# Altium integrated library RF Module.IntLib: 92 symbols (part 1 of 2) (continued)
## 10932 (continued)

## 10933
designator A?, comment XBP24-ASI-001
MODULE XBEE PRO W/RPSMA; Manufacturer: Digi International; Protocol: Zigbee; Frequency: 2.4GHz; DataRate: 250kbps; Power - Output: 18dBm; Sensitivity: -100dBm; Serial Interfaces: UART; Antenna Type: Not Included, RP-SMA; Voltage - Supply: 2.8 V ~ 3.4 V; Current - Receiving: 55mA; Current - Transmitting: 340mA; PartId: 10933; Part Number: XBP24-ASI-001; Supplier 1: Digi-Key; Supplier Part Number 1: XBP24-ASI-001-ND; ComponentLink1Description: Datasheet; ComponentLink1URL: http://www.digi.com/pdf/ds_xbeemultipointmodules.pdf; ComponentLink2Description: Digi-Key Listing; ComponentLink2URL: https://www.digikey.com/product-detail/en/digi-international/XBP24-ASI-001/XBP24-ASI-001-ND/2175373; Price: 47.44; Device Package: Module; Operating Temperature: -40C ~ 85C; RF Family/Standard: 802.15.4; Mounting Type: Through Hole
footprint DIGI XBEE PRO RPSMA FOR HDR
text: AD0/DIO0; VCC; AD1/DIO1; DOUT; AD2/DIO2; DIN/CONFIG; AD3/DIO3; DO8; RTS/AD6/DIO6; RESET; ASSOC/AD5/DIO5; PWM0/RSSI; VREF; PWM1; ON/SLEEP; N/C; CTS/DIO7; DTR/SLEEP_RQ/DI8; AD4/DIO4; GND

## 10934
designator A?, comment XBP24-DMSIT-250
XBEE PRO DIGIMESH 2.4GHZ 63MW; Manufacturer: Digi International; RF Family/Standard: General ISM &gt; 1GHZ; Modulation: DSSS; DataRate: 250kbps; Power - Output: 18dBm; Sensitivity: -100dBm; Serial Interfaces: UART; Antenna Type: Not Included, RP-SMA; Voltage - Supply: 2.8 V ~ 3.4 V; Current - Receiving: 55mA; Current - Transmitting: 340mA; PartId: 10934; Part Number: XBP24-DMSIT-250; Supplier 1: Digi-Key; Supplier Part Number 1: 602-1281-ND; ComponentLink1Description: Datasheet; ComponentLink1URL: http://www.digi.com/pdf/ds_xbeedigimesh24.pdf; ComponentLink2Description: Digi-Key Listing; ComponentLink2URL: https://www.digikey.com/product-detail/en/digi-international/XBP24-DMSIT-250/602-1281-ND/3482755; Price: 47.44; Device Package: Module; Operating Temperature: -40C ~ 85C; Frequency: 2.4GHz; Mounting Type: Through Hole
footprint DIGI XBEE PRO RPSMA FOR HDR
text: AD0/DIO0; VCC; AD1/DIO1; DOUT; AD2/DIO2; DIN/CONFIG; AD3/DIO3; DO8; RTS/AD6/DIO6; RESET; ASSOC/AD5/DIO5; PWM0/RSSI; VREF; PWM1; ON/SLEEP; N/C; CTS/DIO7; DTR/SLEEP_RQ/DI8; AD4/DIO4; GND

## 10935
designator A?, comment XBP9B-DMST-002
MODULE XBEE PRO S3B 900HP RPSMA; Manufacturer: Digi International; RF Family/Standard: General ISM &lt; 1GHz; Modulation: FHSS; Frequency: 900MHz; DataRate: 200kbps; Power - Output: 24dBm; Sensitivity: -101dBm; Serial Interfaces: UART; Antenna Type: Not Included, RP-SMA; Voltage - Supply: 2.1 V ~ 3.6 V; Current - Receiving: 29mA; Current - Transmitting: 215mA; PartId: 10935; Part Number: XBP9B-DMST-002; Supplier 1: Digi-Key; Supplier Part Number 1: 602-1299-ND; ComponentLink1Description: Datasheet; ComponentLink1URL: http://www.digi.com/pdf/ds_xbeepro900hp.pdf; ComponentLink2Description: Digi-Key Listing; ComponentLink2URL: https://www.digikey.com/product-detail/en/digi-international/XBP9B-DMST-002/602-1299-ND/3594157; Price: 54.41; Device Package: Module; Operating Temperature: -40C ~ 85C; Mounting Type: Through Hole
footprint DIGI XBEE PRO RPSMA FOR HDR
text: AD0/DIO0; VCC; AD1/DIO1; DOUT; AD2/DIO2; DIN/CONFIG; AD3/DIO3; DO8; RTS/AD6/DIO6; RESET; ASSOC/AD5/DIO5; PWM0/RSSI; VREF; PWM1; ON/SLEEP; N/C; CTS/DIO7; DTR/SLEEP_RQ/DI8; AD4/DIO4; GND

## 10936
designator A?, comment XBP9B-DPST-001
MODULE XBEE PRO S3B 900HP RPSMA; Manufacturer: Digi International; RF Family/Standard: General ISM &lt; 1GHz; Modulation: FHSS; Frequency: 902MHz ~ 928MHz; DataRate: 200kbps; Power - Output: 24dBm; Sensitivity: -101dBm; Serial Interfaces: SPI, UART; Antenna Type: Not Included, RP-SMA; Voltage - Supply: 2.1 V ~ 3.6 V; Current - Receiving: 29mA; Current - Transmitting: 215mA; PartId: 10936; Part Number: XBP9B-DPST-001; Supplier 1: Digi-Key; Supplier Part Number 1: 602-1349-ND; ComponentLink1Description: Datasheet; ComponentLink1URL: http://www.digi.com/pdf/ds_xbeepro900hp.pdf; ComponentLink2Description: Digi-Key Listing; ComponentLink2URL: https://www.digikey.com/product-detail/en/digi-international/XBP9B-DPST-001/602-1349-ND/3594160; Price: 54.41; Device Package: Module; Operating Temperature: -40C ~ 85C; Mounting Type: Through Hole
footprint DIGI XBEE PRO RPSMA FOR HDR
text: AD0/DIO0; VCC; AD1/DIO1; DOUT; AD2/DIO2; DIN/CONFIG; AD3/DIO3; DO8; RTS/AD6/DIO6; RESET; ASSOC/AD5/DIO5; PWM0/RSSI; VREF; PWM1; ON/SLEEP; N/C; CTS/DIO7; DTR/SLEEP_RQ/DI8; AD4/DIO4; GND

## 10937
designator A?, comment XBP9B-DMSTB002
XBEE PRO DIGIMSH S3B 900HP RPSMA; Manufacturer: Digi International; RF Family/Standard: General ISM &lt; 1GHz; Modulation: FHSS; Frequency: 900MHz; DataRate: 200kbps; Power - Output: 24dBm; Sensitivity: -101dBm; Serial Interfaces: SPI, UART; Antenna Type: Not Included, RP-SMA; Memory Size: 32kB Flash, 2kB RAM; Voltage - Supply: 2.1 V ~ 3.6 V; Current - Receiving: 44mA; Current - Transmitting: 229mA; PartId: 10937; Part Number: XBP9B-DMSTB002; Supplier 1: Digi-Key; Supplier Part Number 1: 602-1346-ND; ComponentLink1Description: Datasheet; ComponentLink1URL: http://www.digi.com/pdf/ds_xbeepro900hp.pdf; ComponentLink2Description: Digi-Key Listing; ComponentLink2URL: https://www.digikey.com/product-detail/en/digi-international/XBP9B-DMSTB002/602-1346-ND/3863548; Price: 58.25; Device Package: Module; Operating Temperature: -40C ~ 85C; Mounting Type: Through Hole
footprint DIGI XBEE PRO RPSMA FOR HDR
text: AD0/DIO0; VCC; AD1/DIO1; DOUT; AD2/DIO2; DIN/CONFIG; AD3/DIO3; DO8; RTS/AD6/DIO6; RESET; ASSOC/AD5/DIO5; PWM0/RSSI; VREF; PWM1; ON/SLEEP; N/C; CTS/DIO7; DTR/SLEEP_RQ/DI8; AD4/DIO4; GND

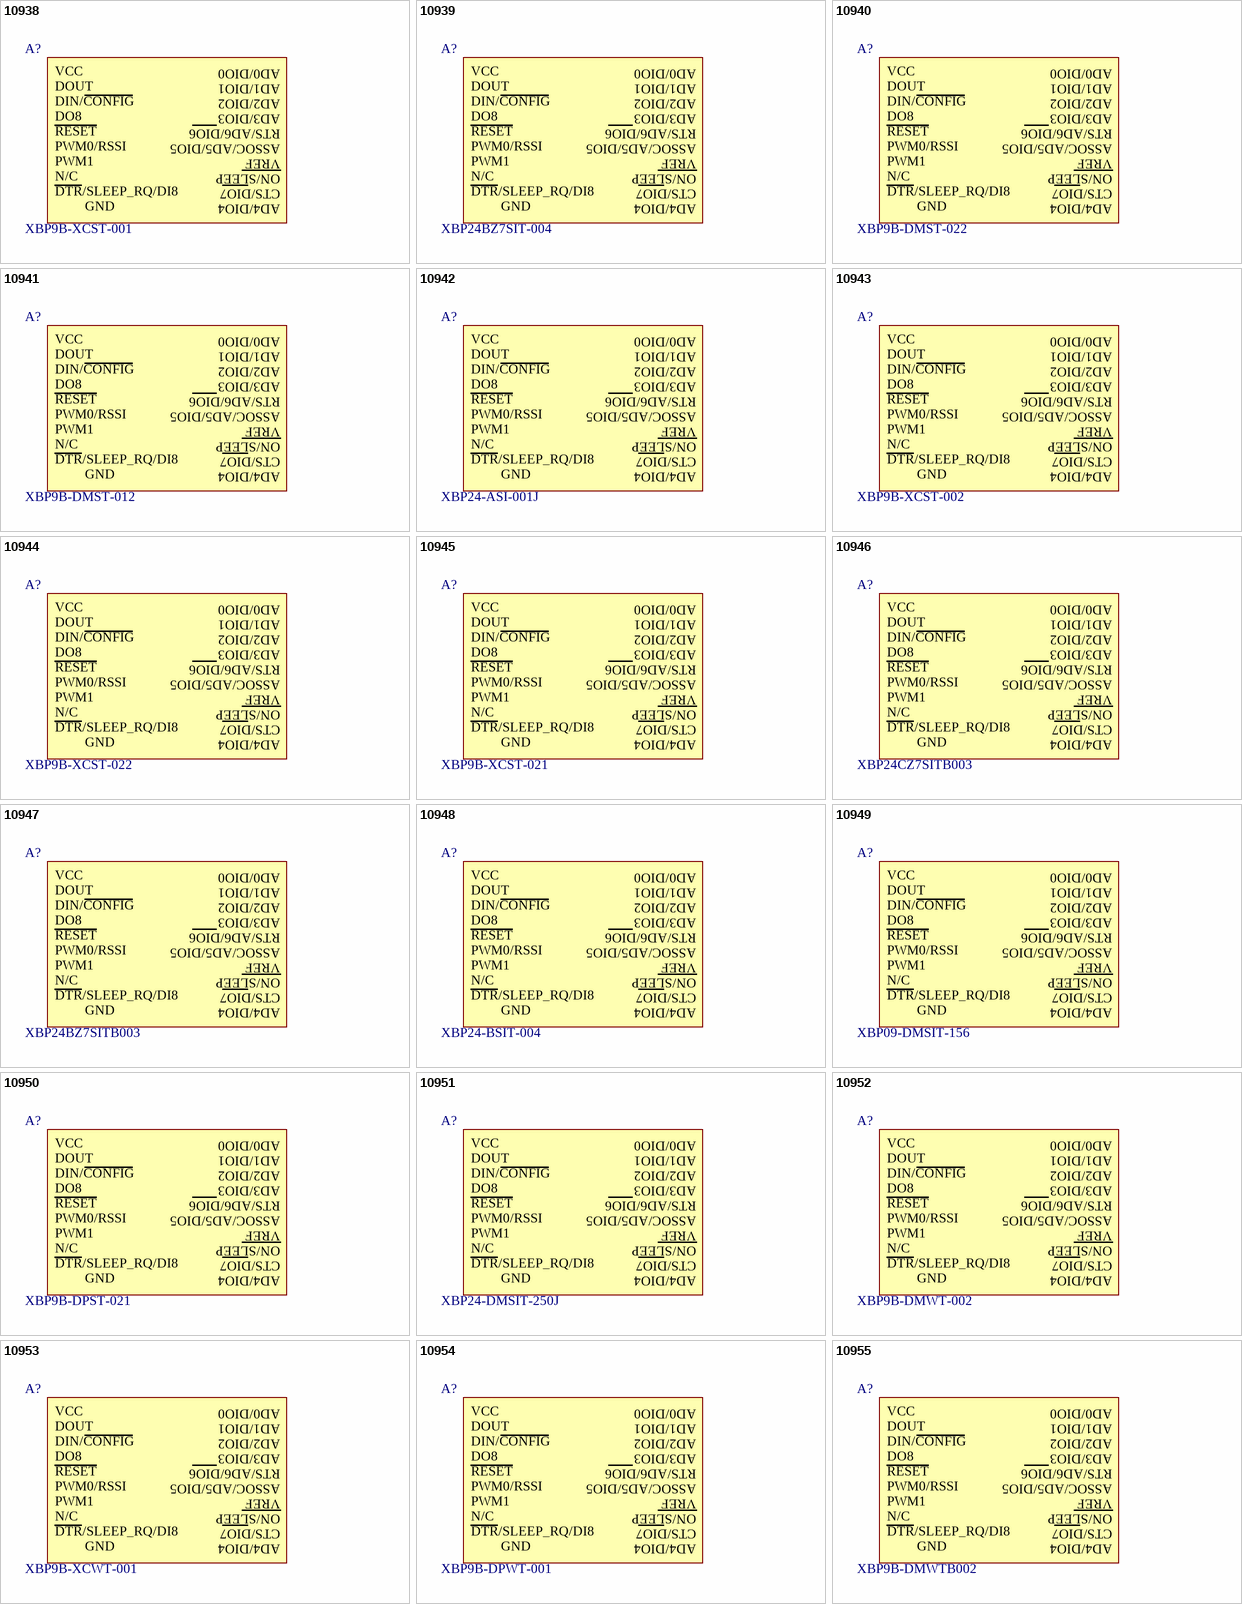
[diagram p3: symbols 10938 to 10955]

## 10938
designator A?, comment XBP9B-XCST-001
XBEE PRO XSC S3B 900MHZ 250MW; Manufacturer: Digi International; RF Family/Standard: General ISM &lt; 1GHz; Modulation: FHSS; Frequency: 902MHz ~ 928MHz; DataRate: 20kbps; Power - Output: 24dBm; Sensitivity: -109dBm; Serial Interfaces: SPI, UART; Antenna Type: Not Included, RP-SMA; Voltage - Supply: 2.4 V ~ 3.6 V; Current - Receiving: 26mA; Current - Transmitting: 215mA; PartId: 10938; Part Number: XBP9B-XCST-001; Supplier 1: Digi-Key; Supplier Part Number 1: 602-1293-ND; ComponentLink1Description: Datasheet; ComponentLink1URL: http://www.digi.com/pdf/ds_xbeeproxsc.pdf; ComponentLink2Description: Digi-Key Listing; ComponentLink2URL: https://www.digikey.com/product-detail/en/digi-international/XBP9B-XCST-001/602-1293-ND/3482817; Price: 58.6; Device Package: Module; Operating Temperature: -40C ~ 85C; Mounting Type: Through Hole
footprint DIGI XBEE PRO RPSMA FOR HDR
text: AD0/DIO0; VCC; AD1/DIO1; DOUT; AD2/DIO2; DIN/CONFIG; AD3/DIO3; DO8; RTS/AD6/DIO6; RESET; ASSOC/AD5/DIO5; PWM0/RSSI; VREF; PWM1; ON/SLEEP; N/C; CTS/DIO7; DTR/SLEEP_RQ/DI8; AD4/DIO4; GND

## 10939
designator A?, comment XBP24BZ7SIT-004
MODULE ZIGBEE-PRO W/RPSMA ANT; Manufacturer: Digi International; Protocol: Zigbee; Frequency: 2.4GHz; DataRate: 250kbps; Power - Output: 18dBm; Sensitivity: -102dBm; Serial Interfaces: IC, PWM, SPI, UART; Antenna Type: Not Included, RP-SMA; Voltage - Supply: 2.7 V ~ 3.6 V; Current - Receiving: 47mA; Current - Transmitting: 205mA; PartId: 10939; Part Number: XBP24BZ7SIT-004; Supplier 1: Digi-Key; Supplier Part Number 1: 602-1180-ND; ComponentLink1Description: Datasheet; ComponentLink1URL: //media.digikey.com/pdf/Data%20Sheets/Digi%20International%20PDFs/xbeezbmodule_ds.pdf; ComponentLink2Description: Digi-Key Listing; ComponentLink2URL: https://www.digikey.com/product-detail/en/digi-international/XBP24BZ7SIT-004/602-1180-ND/2344900; Price: 40.46; Device Package: Module; Operating Temperature: -40C ~ 85C; RF Family/Standard: 802.15.4; Mounting Type: Through Hole
footprint DIGI XBEE PRO RPSMA FOR HDR
text: AD0/DIO0; VCC; AD1/DIO1; DOUT; AD2/DIO2; DIN/CONFIG; AD3/DIO3; DO8; RTS/AD6/DIO6; RESET; ASSOC/AD5/DIO5; PWM0/RSSI; VREF; PWM1; ON/SLEEP; N/C; CTS/DIO7; DTR/SLEEP_RQ/DI8; AD4/DIO4; GND

## 10940
designator A?, comment XBP9B-DMST-022
XBEE PRO RPSMA 250MW 200KBPS; Manufacturer: Digi International; RF Family/Standard: General ISM &lt; 1GHz; Modulation: FHSS; Frequency: 920MHz; Power - Output: 24dBm; Sensitivity: -101dBm; Serial Interfaces: UART; Antenna Type: Not Included, RP-SMA; Voltage - Supply: 2.1 V ~ 3.6 V; Current - Receiving: 29mA; Current - Transmitting: 215mA; PartId: 10940; Part Number: XBP9B-DMST-022; Supplier 1: Digi-Key; Supplier Part Number 1: XBP9B-DMST-022-ND; ComponentLink1Description: Datasheet; ComponentLink1URL: http://www.digi.com/pdf/ds_xbeepro900hp.pdf; ComponentLink2Description: Digi-Key Listing; ComponentLink2URL: https://www.digikey.com/product-detail/en/digi-international/XBP9B-DMST-022/XBP9B-DMST-022-ND/3728682; Price: 54.41; Device Package: Module; Operating Temperature: -40C ~ 85C; DataRate: 200kbps; Mounting Type: Through Hole
footprint DIGI XBEE PRO RPSMA FOR HDR
text: AD0/DIO0; VCC; AD1/DIO1; DOUT; AD2/DIO2; DIN/CONFIG; AD3/DIO3; DO8; RTS/AD6/DIO6; RESET; ASSOC/AD5/DIO5; PWM0/RSSI; VREF; PWM1; ON/SLEEP; N/C; CTS/DIO7; DTR/SLEEP_RQ/DI8; AD4/DIO4; GND

## 10941
designator A?, comment XBP9B-DMST-012
XBEE PRO DIGMESH S3B 900HP RPSMA; Manufacturer: Digi International; RF Family/Standard: General ISM &lt; 1GHz; Modulation: FHSS; Frequency: 902MHz ~ 928MHz; DataRate: 200kbps; Power - Output: 24dBm; Sensitivity: -101dBm; Serial Interfaces: UART; Antenna Type: Not Included, RP-SMA; Voltage - Supply: 2.1 V ~ 3.6 V; Current - Receiving: 29mA; Current - Transmitting: 215mA; PartId: 10941; Part Number: XBP9B-DMST-012; Supplier 1: Digi-Key; Supplier Part Number 1: 602-1304-ND; ComponentLink1Description: Datasheet; ComponentLink1URL: http://www.digi.com/pdf/ds_xbeepro900hp.pdf; ComponentLink2Description: Digi-Key Listing; ComponentLink2URL: https://www.digikey.com/product-detail/en/digi-international/XBP9B-DMST-012/602-1304-ND/3911190; Price: 54.41; Device Package: Module; Operating Temperature: -40C ~ 85C; Mounting Type: Through Hole
footprint DIGI XBEE PRO RPSMA FOR HDR
text: AD0/DIO0; VCC; AD1/DIO1; DOUT; AD2/DIO2; DIN/CONFIG; AD3/DIO3; DO8; RTS/AD6/DIO6; RESET; ASSOC/AD5/DIO5; PWM0/RSSI; VREF; PWM1; ON/SLEEP; N/C; CTS/DIO7; DTR/SLEEP_RQ/DI8; AD4/DIO4; GND

## 10942
designator A?, comment XBP24-ASI-001J
XBEE PRO 802.15.4 10MW RPSMA; Manufacturer: Digi International; Protocol: Zigbee; Frequency: 2.4GHz; DataRate: 250kbps; Power - Output: 10dBm; Sensitivity: -100dBm; Serial Interfaces: UART; Antenna Type: Not Included, RP-SMA; Voltage - Supply: 2.8 V ~ 3.4 V; Current - Receiving: 55mA; Current - Transmitting: 180mA; PartId: 10942; Part Number: XBP24-ASI-001J; Supplier 1: Digi-Key; Supplier Part Number 1: 602-1478-ND; ComponentLink1Description: Datasheet; ComponentLink1URL: http://www.digi.com/pdf/ds_xbeemultipointmodules.pdf; ComponentLink2Description: Digi-Key Listing; ComponentLink2URL: https://www.digikey.com/product-detail/en/digi-international/XBP24-ASI-001J/602-1478-ND/3482670; Price: 47.44; Device Package: Module; Operating Temperature: -40C ~ 85C; RF Family/Standard: 802.15.4; Mounting Type: Through Hole
footprint DIGI XBEE PRO RPSMA FOR HDR
text: AD0/DIO0; VCC; AD1/DIO1; DOUT; AD2/DIO2; DIN/CONFIG; AD3/DIO3; DO8; RTS/AD6/DIO6; RESET; ASSOC/AD5/DIO5; PWM0/RSSI; VREF; PWM1; ON/SLEEP; N/C; CTS/DIO7; DTR/SLEEP_RQ/DI8; AD4/DIO4; GND

## 10943
designator A?, comment XBP9B-XCST-002
XBEE PRO XSC S3B 900MHZ 250MW; Manufacturer: Digi International; RF Family/Standard: General ISM &lt; 1GHz; Modulation: FHSS; Frequency: 902MHz ~ 928MHz; DataRate: 20kbps; Power - Output: 24dBm; Sensitivity: -107dBm; Serial Interfaces: SPI, UART; Antenna Type: Not Included, RP-SMA; Voltage - Supply: 2.4 V ~ 3.6 V; Current - Receiving: 26mA; Current - Transmitting: 215mA; PartId: 10943; Part Number: XBP9B-XCST-002; Supplier 1: Digi-Key; Supplier Part Number 1: 602-1294-ND; ComponentLink1Description: Datasheet; ComponentLink1URL: http://www.digi.com/pdf/ds_xbeeproxsc.pdf; ComponentLink2Description: Digi-Key Listing; ComponentLink2URL: https://www.digikey.com/product-detail/en/digi-international/XBP9B-XCST-002/602-1294-ND/3482818; Price: 58.6; Device Package: Module; Operating Temperature: -40C ~ 85C; Mounting Type: Through Hole
footprint DIGI XBEE PRO RPSMA FOR HDR
text: AD0/DIO0; VCC; AD1/DIO1; DOUT; AD2/DIO2; DIN/CONFIG; AD3/DIO3; DO8; RTS/AD6/DIO6; RESET; ASSOC/AD5/DIO5; PWM0/RSSI; VREF; PWM1; ON/SLEEP; N/C; CTS/DIO7; DTR/SLEEP_RQ/DI8; AD4/DIO4; GND

## 10944
designator A?, comment XBP9B-XCST-022
XBEE PRO XSC S3B 900MHZ 250MW; Manufacturer: Digi International; RF Family/Standard: General ISM &lt; 1GHz; Modulation: FHSS; Frequency: 902MHz ~ 928MHz; DataRate: 20kbps; Power - Output: 24dBm; Sensitivity: -107dBm; Serial Interfaces: SPI, UART; Antenna Type: Not Included, RP-SMA; Voltage - Supply: 2.4 V ~ 3.6 V; Current - Receiving: 26mA; Current - Transmitting: 215mA; PartId: 10944; Part Number: XBP9B-XCST-022; Supplier 1: Digi-Key; Supplier Part Number 1: 602-1353-ND; ComponentLink1Description: Datasheet; ComponentLink1URL: http://www.digi.com/pdf/ds_xbeeproxsc.pdf; ComponentLink2Description: Digi-Key Listing; ComponentLink2URL: https://www.digikey.com/product-detail/en/digi-international/XBP9B-XCST-022/602-1353-ND/3482820; Price: 58.6; Device Package: Module; Operating Temperature: -40C ~ 85C; Mounting Type: Through Hole
footprint DIGI XBEE PRO RPSMA FOR HDR
text: AD0/DIO0; VCC; AD1/DIO1; DOUT; AD2/DIO2; DIN/CONFIG; AD3/DIO3; DO8; RTS/AD6/DIO6; RESET; ASSOC/AD5/DIO5; PWM0/RSSI; VREF; PWM1; ON/SLEEP; N/C; CTS/DIO7; DTR/SLEEP_RQ/DI8; AD4/DIO4; GND

## 10945
designator A?, comment XBP9B-XCST-021
XBEE PRO XSC S3B 900MHZ 250MW; Manufacturer: Digi International; RF Family/Standard: General ISM &lt; 1GHz; Modulation: FHSS; Frequency: 902MHz ~ 928MHz; DataRate: 20kbps; Power - Output: 24dBm; Sensitivity: -109dBm; Serial Interfaces: SPI, UART; Antenna Type: Not Included, RP-SMA; Voltage - Supply: 2.4 V ~ 3.6 V; Current - Receiving: 26mA; Current - Transmitting: 215mA; PartId: 10945; Part Number: XBP9B-XCST-021; Supplier 1: Digi-Key; Supplier Part Number 1: 602-1352-ND; ComponentLink1Description: Datasheet; ComponentLink1URL: http://www.digi.com/pdf/ds_xbeeproxsc.pdf; ComponentLink2Description: Digi-Key Listing; ComponentLink2URL: https://www.digikey.com/product-detail/en/digi-international/XBP9B-XCST-021/602-1352-ND/3482819; Price: 58.6; Device Package: Module; Operating Temperature: -40C ~ 85C; Mounting Type: Through Hole
footprint DIGI XBEE PRO RPSMA FOR HDR
text: AD0/DIO0; VCC; AD1/DIO1; DOUT; AD2/DIO2; DIN/CONFIG; AD3/DIO3; DO8; RTS/AD6/DIO6; RESET; ASSOC/AD5/DIO5; PWM0/RSSI; VREF; PWM1; ON/SLEEP; N/C; CTS/DIO7; DTR/SLEEP_RQ/DI8; AD4/DIO4; GND

## 10946
designator A?, comment XBP24CZ7SITB003
MODULE XBEE W/RPSMA ANT; Manufacturer: Digi International; Protocol: Zigbee; Frequency: 2.4GHz; DataRate: 250kbps; Power - Output: 18dBm; Sensitivity: -101dBm; Serial Interfaces: SPI, UART; Antenna Type: Not Included, RP-SMA; Memory Size: 32kB Flash, 2kB RAM; Voltage - Supply: 2.7 V ~ 3.6 V; Current - Receiving: 45mA; Current - Transmitting: 120mA; PartId: 10946; Part Number: XBP24CZ7SITB003; Supplier 1: Digi-Key; Supplier Part Number 1: 602-1860-ND; ComponentLink1Description: Datasheet; ComponentLink1URL: http://www.digi.com/pdf/ds_xbee_zigbee.pdf; ComponentLink2Description: Digi-Key Listing; ComponentLink2URL: https://www.digikey.com/product-detail/en/digi-international/XBP24CZ7SITB003/602-1860-ND/5322882; Price: 43.6; Device Package: Module; Operating Temperature: -40C ~ 85C; RF Family/Standard: 802.15.4; Mounting Type: Through Hole
footprint DIGI XBEE PRO RPSMA FOR HDR
text: AD0/DIO0; VCC; AD1/DIO1; DOUT; AD2/DIO2; DIN/CONFIG; AD3/DIO3; DO8; RTS/AD6/DIO6; RESET; ASSOC/AD5/DIO5; PWM0/RSSI; VREF; PWM1; ON/SLEEP; N/C; CTS/DIO7; DTR/SLEEP_RQ/DI8; AD4/DIO4; GND

## 10947
designator A?, comment XBP24BZ7SITB003
MODULE ZIGBEE-PRO W/RPSMA ANT; Manufacturer: Digi International; Protocol: Zigbee; Frequency: 2.4GHz; DataRate: 250kbps; Power - Output: 18dBm; Sensitivity: -102dBm; Serial Interfaces: IC, PWM, SPI, UART; Antenna Type: Not Included, RP-SMA; Voltage - Supply: 2.7 V ~ 3.6 V; Current - Receiving: 62mA; Current - Transmitting: 220mA; PartId: 10947; Part Number: XBP24BZ7SITB003; Supplier 1: Digi-Key; Supplier Part Number 1: 602-1190-ND; ComponentLink1Description: Datasheet; ComponentLink1URL: //media.digikey.com/pdf/Data%20Sheets/Digi%20International%20PDFs/xbeezbmodule_ds.pdf; ComponentLink2Description: Digi-Key Listing; ComponentLink2URL: https://www.digikey.com/product-detail/en/digi-international/XBP24BZ7SITB003/602-1190-ND/2522070; Price: 42.9; Device Package: Module; Operating Temperature: -40C ~ 85C; RF Family/Standard: 802.15.4; Mounting Type: Through Hole
footprint DIGI XBEE PRO RPSMA FOR HDR
text: AD0/DIO0; VCC; AD1/DIO1; DOUT; AD2/DIO2; DIN/CONFIG; AD3/DIO3; DO8; RTS/AD6/DIO6; RESET; ASSOC/AD5/DIO5; PWM0/RSSI; VREF; PWM1; ON/SLEEP; N/C; CTS/DIO7; DTR/SLEEP_RQ/DI8; AD4/DIO4; GND

## 10948
designator A?, comment XBP24-BSIT-004
MODULE XBEE PRO ZNET 2.5 W/RPSMA; Manufacturer: Digi International; Protocol: Zigbee; Frequency: 2.4GHz; DataRate: 250kbps; Power - Output: 18dBm; Sensitivity: -102dBm; Serial Interfaces: UART; Antenna Type: Not Included, RP-SMA; Voltage - Supply: 2.7 V ~ 3.6 V; Current - Receiving: 47mA; Current - Transmitting: 205mA; PartId: 10948; Part Number: XBP24-BSIT-004; Supplier 1: Digi-Key; Supplier Part Number 1: XBP24-BSIT-004-ND; ComponentLink1Description: Datasheet; ComponentLink1URL: //media.digikey.com/pdf/Data%20Sheets/Digi%20International%20PDFs/xbeezbmodule_ds.pdf; ComponentLink2Description: Digi-Key Listing; ComponentLink2URL: https://www.digikey.com/product-detail/en/digi-international/XBP24-BSIT-004/XBP24-BSIT-004-ND/1870580; Price: 50.23; Device Package: Module; Operating Temperature: -40C ~ 85C; RF Family/Standard: 802.15.4; Mounting Type: Through Hole
footprint DIGI XBEE PRO RPSMA FOR HDR
text: AD0/DIO0; VCC; AD1/DIO1; DOUT; AD2/DIO2; DIN/CONFIG; AD3/DIO3; DO8; RTS/AD6/DIO6; RESET; ASSOC/AD5/DIO5; PWM0/RSSI; VREF; PWM1; ON/SLEEP; N/C; CTS/DIO7; DTR/SLEEP_RQ/DI8; AD4/DIO4; GND

## 10949
designator A?, comment XBP09-DMSIT-156
MODULE XBEE PRO W/RPSMA; Manufacturer: Digi International; Protocol: Zigbee; Frequency: 900MHz; DataRate: 156kbps; Power - Output: 17dBm; Sensitivity: -100dBm; Antenna Type: Not Included, RP-SMA; Voltage - Supply: 3 V ~ 3.6 V; Current - Receiving: 80mA; Current - Transmitting: 210mA; PartId: 10949; Part Number: XBP09-DMSIT-156; Supplier 1: Digi-Key; Supplier Part Number 1: 602-1476-ND; ComponentLink1Description: Datasheet; ComponentLink1URL: http://ftp1.digi.com/support/documentation/90000903_G.pdf; ComponentLink2Description: Digi-Key Listing; ComponentLink2URL: https://www.digikey.com/product-detail/en/digi-international/XBP09-DMSIT-156/602-1476-ND/2619086; Price: 58.6; Device Package: Module; Operating Temperature: -40C ~ 85C; RF Family/Standard: 802.15.4; Mounting Type: Through Hole
footprint DIGI XBEE PRO RPSMA FOR HDR
text: AD0/DIO0; VCC; AD1/DIO1; DOUT; AD2/DIO2; DIN/CONFIG; AD3/DIO3; DO8; RTS/AD6/DIO6; RESET; ASSOC/AD5/DIO5; PWM0/RSSI; VREF; PWM1; ON/SLEEP; N/C; CTS/DIO7; DTR/SLEEP_RQ/DI8; AD4/DIO4; GND

## 10950
designator A?, comment XBP9B-DPST-021
XBEE PRO RPSMA 250MW 10KBPS; Manufacturer: Digi International; RF Family/Standard: General ISM &lt; 1GHz; Modulation: FHSS; Frequency: 902MHz ~ 928MHz; Power - Output: 24dBm; Sensitivity: -110dBm; Serial Interfaces: SPI, UART; Antenna Type: Not Included, RP-SMA; Voltage - Supply: 2.1 V ~ 3.6 V; Current - Receiving: 29mA; Current - Transmitting: 215mA; PartId: 10950; Part Number: XBP9B-DPST-021; Supplier 1: Digi-Key; Supplier Part Number 1: 602-1488-ND; ComponentLink1Description: Datasheet; ComponentLink1URL: http://www.digi.com/pdf/ds_xbeepro900hp.pdf; ComponentLink2Description: Digi-Key Listing; ComponentLink2URL: https://www.digikey.com/product-detail/en/digi-international/XBP9B-DPST-021/602-1488-ND/3728685; Price: 54.41; Device Package: Module; Operating Temperature: -40C ~ 85C; DataRate: 10kbps; Mounting Type: Through Hole
footprint DIGI XBEE PRO RPSMA FOR HDR
text: AD0/DIO0; VCC; AD1/DIO1; DOUT; AD2/DIO2; DIN/CONFIG; AD3/DIO3; DO8; RTS/AD6/DIO6; RESET; ASSOC/AD5/DIO5; PWM0/RSSI; VREF; PWM1; ON/SLEEP; N/C; CTS/DIO7; DTR/SLEEP_RQ/DI8; AD4/DIO4; GND

## 10951
designator A?, comment XBP24-DMSIT-250J
XBEE PRO DIGIMESH 2.4GHZ 63MW; Manufacturer: Digi International; RF Family/Standard: General ISM &gt; 1GHZ; Modulation: DSSS; DataRate: 250kbps; Power - Output: 10dBm; Sensitivity: -100dBm; Serial Interfaces: UART; Antenna Type: Not Included, RP-SMA; Voltage - Supply: 2.8 V ~ 3.4 V; Current - Receiving: 55mA; Current - Transmitting: 180mA; PartId: 10951; Part Number: XBP24-DMSIT-250J; Supplier 1: Digi-Key; Supplier Part Number 1: 602-1809-ND; ComponentLink1Description: Datasheet; ComponentLink1URL: http://www.digi.com/pdf/ds_xbeedigimesh24.pdf; ComponentLink2Description: Digi-Key Listing; ComponentLink2URL: https://www.digikey.com/product-detail/en/digi-international/XBP24-DMSIT-250J/602-1809-ND/3482756; Price: 47.44; Device Package: Module; Operating Temperature: -40C ~ 85C; Frequency: 2.4GHz; Mounting Type: Through Hole
footprint DIGI XBEE PRO RPSMA FOR HDR
text: AD0/DIO0; VCC; AD1/DIO1; DOUT; AD2/DIO2; DIN/CONFIG; AD3/DIO3; DO8; RTS/AD6/DIO6; RESET; ASSOC/AD5/DIO5; PWM0/RSSI; VREF; PWM1; ON/SLEEP; N/C; CTS/DIO7; DTR/SLEEP_RQ/DI8; AD4/DIO4; GND

## 10952
designator A?, comment XBP9B-DMWT-002
MODULE XBEE PRO S3B 900HP WR ANT; Manufacturer: Digi International; RF Family/Standard: General ISM &lt; 1GHz; Modulation: FHSS; Frequency: 900MHz; DataRate: 200kbps; Power - Output: 24dBm; Sensitivity: -101dBm; Serial Interfaces: SPI, UART; Antenna Type: Integrated, Wire Antenna; Voltage - Supply: 2.1 V ~ 3.6 V; Current - Receiving: 29mA; Current - Transmitting: 215mA; PartId: 10952; Part Number: XBP9B-DMWT-002; Supplier 1: Digi-Key; Supplier Part Number 1: 602-1301-ND; ComponentLink1Description: Datasheet; ComponentLink1URL: http://www.digi.com/pdf/ds_xbeepro900hp.pdf; ComponentLink2Description: Digi-Key Listing; ComponentLink2URL: https://www.digikey.com/product-detail/en/digi-international/XBP9B-DMWT-002/602-1301-ND/3594159; Price: 54.41; Device Package: Module; Operating Temperature: -40C ~ 85C; Mounting Type: Through Hole
footprint DIGI XBEE PRO WIRE 900 FOR HDR
text: AD0/DIO0; VCC; AD1/DIO1; DOUT; AD2/DIO2; DIN/CONFIG; AD3/DIO3; DO8; RTS/AD6/DIO6; RESET; ASSOC/AD5/DIO5; PWM0/RSSI; VREF; PWM1; ON/SLEEP; N/C; CTS/DIO7; DTR/SLEEP_RQ/DI8; AD4/DIO4; GND

## 10953
designator A?, comment XBP9B-XCWT-001
XBEE PRO XSC S3B 900MHZ 250MW; Manufacturer: Digi International; RF Family/Standard: General ISM &lt; 1GHz; Modulation: FHSS; Frequency: 902MHz ~ 928MHz; DataRate: 10kbps; Power - Output: 24dBm; Sensitivity: -109dBm; Serial Interfaces: SPI, UART; Antenna Type: Integrated, Wire Antenna; Voltage - Supply: 2.4 V ~ 3.6 V; Current - Receiving: 26mA; Current - Transmitting: 215mA; PartId: 10953; Part Number: XBP9B-XCWT-001; Supplier 1: Digi-Key; Supplier Part Number 1: 602-1297-ND; ComponentLink1Description: Datasheet; ComponentLink1URL: http://www.digi.com/pdf/ds_xbeeproxsc.pdf; ComponentLink2Description: Digi-Key Listing; ComponentLink2URL: https://www.digikey.com/product-detail/en/digi-international/XBP9B-XCWT-001/602-1297-ND/3482824; Price: 54.41; Device Package: Module; Operating Temperature: -40C ~ 85C; Mounting Type: Through Hole
footprint DIGI XBEE PRO WIRE 900 FOR HDR
text: AD0/DIO0; VCC; AD1/DIO1; DOUT; AD2/DIO2; DIN/CONFIG; AD3/DIO3; DO8; RTS/AD6/DIO6; RESET; ASSOC/AD5/DIO5; PWM0/RSSI; VREF; PWM1; ON/SLEEP; N/C; CTS/DIO7; DTR/SLEEP_RQ/DI8; AD4/DIO4; GND

## 10954
designator A?, comment XBP9B-DPWT-001
MODULE XBEE PRO S3B 900HP WR ANT; Manufacturer: Digi International; RF Family/Standard: General ISM &lt; 1GHz; Modulation: FHSS; Frequency: 902MHz ~ 928MHz; DataRate: 10kbps; Power - Output: 24dBm; Sensitivity: -110dBm; Serial Interfaces: SPI, UART; Antenna Type: Integrated, Wire Antenna; Voltage - Supply: 2.1 V ~ 3.6 V; Current - Receiving: 29mA; Current - Transmitting: 215mA; PartId: 10954; Part Number: XBP9B-DPWT-001; Supplier 1: Digi-Key; Supplier Part Number 1: 602-1351-ND; ComponentLink1Description: Datasheet; ComponentLink1URL: http://www.digi.com/pdf/ds_xbeepro900hp.pdf; ComponentLink2Description: Digi-Key Listing; ComponentLink2URL: https://www.digikey.com/product-detail/en/digi-international/XBP9B-DPWT-001/602-1351-ND/3594162; Price: 54.41; Device Package: Module; Operating Temperature: -40C ~ 85C; Mounting Type: Through Hole
footprint DIGI XBEE PRO WIRE 900 FOR HDR
text: AD0/DIO0; VCC; AD1/DIO1; DOUT; AD2/DIO2; DIN/CONFIG; AD3/DIO3; DO8; RTS/AD6/DIO6; RESET; ASSOC/AD5/DIO5; PWM0/RSSI; VREF; PWM1; ON/SLEEP; N/C; CTS/DIO7; DTR/SLEEP_RQ/DI8; AD4/DIO4; GND

## 10955
designator A?, comment XBP9B-DMWTB002
XBEE PRO DIGIMESH S3B 900HP WIRE; Manufacturer: Digi International; RF Family/Standard: General ISM &lt; 1GHz; Modulation: FHSS; Frequency: 900MHz; DataRate: 200kbps; Power - Output: 24dBm; Sensitivity: -101dBm; Serial Interfaces: SPI, UART; Antenna Type: Integrated, Wire Antenna; Memory Size: 32kB Flash, 2kB RAM; Voltage - Supply: 2.1 V ~ 3.6 V; Current - Receiving: 29mA; Current - Transmitting: 215mA; PartId: 10955; Part Number: XBP9B-DMWTB002; Supplier 1: Digi-Key; Supplier Part Number 1: 602-1348-ND; ComponentLink1Description: Datasheet; ComponentLink1URL: http://www.digi.com/pdf/ds_xbeepro900hp.pdf; ComponentLink2Description: Digi-Key Listing; ComponentLink2URL: https://www.digikey.com/product-detail/en/digi-international/XBP9B-DMWTB002/602-1348-ND/3863552; Price: 58.25; Device Package: Module; Operating Temperature: -40C ~ 85C; Mounting Type: Through Hole
footprint DIGI XBEE PRO WIRE 900 FOR HDR
